# Altium footprint library mainLib.PcbLib: 169 footprints (part 4 of 11)
Each footprint in its own frame and in the unit in brackets; x right, y up, seen from the top. Pads: shape width x height; smd on the part's side, far side on the other; paste and mask are expansions set on the pad; w line width, h text height; cw(c..) or ccw(c..) is an arc to the next point about the centre after c.
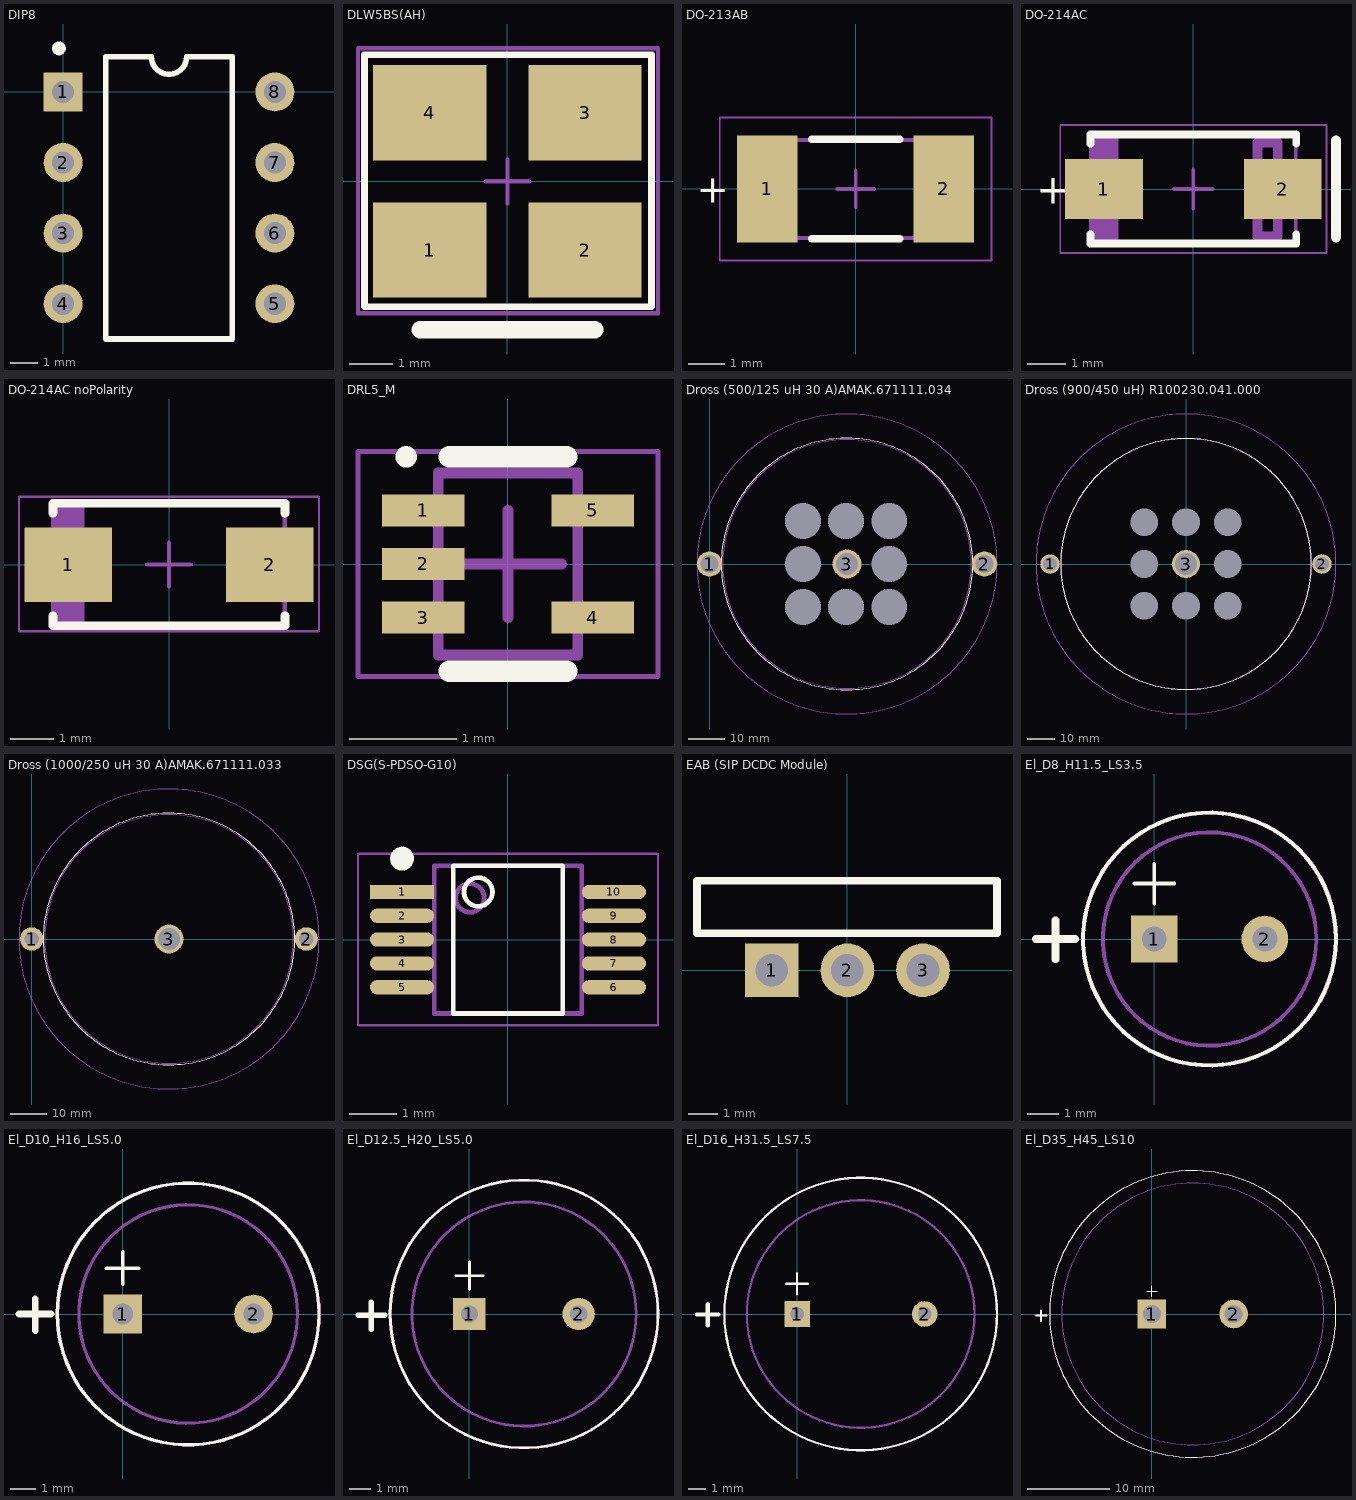
[diagram p3: the footprints below, top view; thin cyan lines are the x and y axes]

## DIP8 [mm]
pads (8):
  rect 1.4x1.4 / inner rect 0x0 / far side rect 1.4x1.4 hole 0.8: 1(0,0)
  round 1.4 / inner round 0 / far side round 1.4 hole 0.8: 2(0,-2.54) 3(0,-5.08) 4(0,-7.62) 5(7.62,-7.62) 6(7.62,-5.08) 7(7.62,-2.54) 8(7.62,0)
Top Overlay:
  circle w0.25: c-0.15,1.565 r0.125
  lines w0.2: 1.535,-8.89 6.085,-8.89 6.085,1.27 4.445,1.27 cw(c3.81,1.27) 3.175,1.27 1.535,1.27 1.535,-8.89
3D body "SW3DPS-DIP8-DEFAULT.STEP": height 3.91, standoff -2.95, extent -0.127,-9.525 7.747,1.905

## DLW5BS(AH) [mil] "SMD Inductor"
height 177.17
pads (4):
  rect 102.24x86 smd: 1(-70,-62) 2(70,-62) 3(70,62) 4(-70,62)
Top Overlay:
  lines w6: -128.94,-113.19 129.92,-113.19 129.92,114.17 -128.94,114.17 -128.94,-113.19
  lines w15.75: -78.74,-133.86 78.74,-133.86
Mechanical 15:
  lines w3.94: -19.69,0 19.68,0 ; 0,-19.69 0,19.68 ; -134.84,-119.09 -134.84,120.08 135.83,120.08 135.83,-119.09 -134.84,-119.09
3D body "User Library-DLW5BT.STEP": height 96.5, standoff 0, extent -98.43,-96.46 98.43,100.39

## DO-213AB [mm] "MELF Diode, 2-Leads, Body 4,95x2,54mm, IPC Low Density"
height 2.67
pads (2):
  rect 1.65x2.9 smd: 1(-2.4,0) 2(2.4,0)
Top Overlay:
  lines w0.2: -1.2,-1.35 1.2,-1.35 ; -1.2,1.35 1.2,1.35
  text "+" at -4.318,-0.381 h0.76
Mechanical 13:
  lines w0.1: -2.6,-1.335 2.6,-1.335 2.6,1.335 -2.6,1.335 -2.6,-1.335
Mechanical 15:
  lines w0.05: -3.7,-1.95 3.7,-1.95 3.7,1.95 -3.7,1.95 -3.7,-1.95
  lines w0.1: -0.5,0 0.5,0 ; 0,-0.5 0,0.5
3D body "DIOMELF5025M.step": height 2.54, standoff 0, extent -2.475,-1.27 2.475,1.27

## DO-214AC [mm] "Molded Diode, 2-Leads, Body 5,10x2,67mm, IPC Medium Density"
height 2.29
pads (2):
  rect 2x1.55 smd: 1(-2.3,0) 2(2.3,0)
Top Overlay:
  lines w0.2: -2.65,-1.175 -2.65,-1.4 2.65,-1.4 2.65,-1.175 ; -2.65,1.175 -2.65,1.4 2.65,1.4 2.65,1.175
  lines w0.254: 3.675,-1.25 3.675,1.25
  text "+" at -4.05,-0.375 h0.76
Mechanical 13:
  rectangle: -2.64,-1.395 -1.93,1.395
  lines w0.1: -2.64,-1.395 2.64,-1.395 2.64,1.395 -2.64,1.395 -2.64,-1.395
  lines w0.254: 1.65,-1.225 2.175,-1.225 2.175,1.2 1.65,1.2 1.65,-1.225
Mechanical 15:
  lines w0.05: -3.425,-1.65 3.425,-1.65 3.425,1.65 -3.425,1.65 -3.425,-1.65
  lines w0.1: -0.5,0 0.5,0 ; 0,-0.5 0,0.5
3D body "DIOM5127X23N.step": height 2.29, standoff 0, extent -2.86,-1.395 2.86,1.395
3D body: height 2.3, standoff 2.29, extent 1.651,-1.224 2.174,1.199

## DO-214AC noPolarity [mm] "Molded Diode, 2-Leads, Body 5,10x2,67mm, IPC Medium Density"
height 2.29
pads (2):
  rect 2x1.7 smd: 1(-2.3,0) 2(2.3,0)
Top Overlay:
  lines w0.2: -2.65,-1.175 -2.65,-1.4 2.65,-1.4 2.65,-1.175 ; -2.65,1.175 -2.65,1.4 2.65,1.4 2.65,1.175
Mechanical 13:
  rectangle: -2.64,-1.395 -1.93,1.395
  lines w0.1: -2.64,-1.395 -2.64,1.395 2.64,1.395 2.64,-1.395 -2.64,-1.395
Mechanical 15:
  lines w0.05: -3.425,-1.525 -3.425,1.55 3.425,1.55 3.425,-1.525 -3.425,-1.525
  lines w0.1: -0.5,0 0.5,0 ; 0,-0.5 0,0.5
3D body "DIOM5127X23N.step": height 2.29, standoff 0, extent -2.86,-1.395 2.86,1.395

## DRL5_M [mm] "SOTFL, 5-Flat Leads, Body 1.2x1.6x0.6mm, Pitch 0.5mm, IPC Low Density"
height 0.6
pads (5):
  rect 0.77x0.3 smd: 1(-0.79,0.5) 2(-0.79,0) 3(-0.79,-0.5) 4(0.79,-0.5) 5(0.79,0.5)
Top Overlay:
  circle w0.1: c-0.95,1 r0.05
  lines w0.2: -0.55,-1 0.55,-1 ; -0.55,1 0.55,1
Mechanical 13:
  lines w0.1: -0.65,-0.85 0.65,-0.85 0.65,0.85 -0.65,0.85 -0.65,-0.85
Mechanical 15:
  lines w0.05: -1.4,-1.05 1.4,-1.05 1.4,1.05 -1.4,1.05 -1.4,-1.05
  lines w0.1: -0.5,0 0.5,0 ; 0,-0.5 0,0.5
3D body: height 0.6, standoff 0, extent -0.65,-0.85 0.65,0.85

## Dross (500/125 uH 30 A)AMAK.671111.034 [mm]
pads (11):
  round 0 hole 10: 0(26,-12) 0(26,0) 0(26,12) 0(38,-12) 0(38,12) 0(50,-12) 0(50,0) 0(50,12)
  round 7 hole 5: 1(0,0) 2(76.5,0)
  round 8 hole 6: 3(38.25,0)
Top Overlay:
  circle w0.254: c38.25,0 r35.001
Mechanical 13:
  circle w0.254: c38.25,0 r34.602
Mechanical 15:
  circle w0.254: c38.25,0 r41.75
3D body: height 37, standoff 0, extent 3.648,-34.602 72.852,34.602
3D body: height 11.56, standoff 0, extent -2.666,-8 13.334,8

## Dross (900/450 uH) R100230.041.000 [mm]
pads (11):
  round 0 hole 10: 0(-15,-15) 0(-15,0) 0(-15,15) 0(0,-15) 0(0,15) 0(15,-15) 0(15,0) 0(15,15)
  round 7 hole 5: 1(-48.8,-0.025) 2(48.8,0)
  round 10 hole 8: 3(0,0)
Top Overlay:
  circle w0.254: c0,0 r45
Mechanical 13:
  circle w0.254: c0,0 r44.904
Mechanical 15:
  circle w0.254: c0,0 r53.825
3D body: height 52, standoff 0, extent -45.005,-45.107 45.2,45.214
3D body: height 11.56, standoff 0, extent -40.916,-8 -24.916,8

## Dross (1000/250 uH 30 A)AMAK.671111.033 [mm]
pads (3):
  round 6.5 hole 4: 1(0,0) 2(76.5,0)
  round 8 hole 6: 3(38.25,0)
Top Overlay:
  circle w0.254: c38.25,0 r35.001
Mechanical 13:
  circle w0.254: c38.25,0 r34.602
Mechanical 15:
  circle w0.254: c38.25,0 r41.75
3D body: height 62, standoff 0, extent 3.648,-34.602 72.852,34.602
3D body: height 11.56, standoff 0, extent -2.666,-8 13.334,8

## DSG(S-PDSO-G10) [mm]
height 1.1
pads (10):
  rect 1.35x0.3 smd mask+0.07: 1(-2.225,1)
  oval 1.35x0.3 smd mask+0.07: 2(-2.225,0.5) 3(-2.225,0) 4(-2.225,-0.5) 5(-2.225,-1) 6(2.225,-1) 7(2.225,-0.5) 8(2.225,0) 9(2.225,0.5) 10(2.225,1)
Top Overlay:
  circle w0.25: c-2.225,1.7 r0.125
  circle w0.1: c-0.625,1 r0.3
  lines w0.1: -1.15,-1.55 -1.15,1.55 1.15,1.55 1.15,-1.55 -1.15,-1.55
Mechanical 13:
  circle w0.1: c-0.8,0.875 r0.3
  lines w0.1: -1.55,-1.55 -1.55,1.55 1.55,1.55 1.55,-1.55 -1.55,-1.55
Mechanical 15:
  lines w0.05: -3.15,-1.8 -3.15,1.8 3.15,1.8 3.15,-1.8 -3.15,-1.8
3D body "DSG(S-PDSO-G10).step": height 1.1, standoff 0, extent -2.45,-1.55 2.45,1.55

## EAB (SIP DCDC Module) [mm]
pads (3):
  rect 1.8x1.8 hole 1.1: 1(-2.54,0)
  round 1.8 hole 1.1: 2(0,0) 3(2.54,0)
Top Overlay:
  lines w0.254: -5.05,1.25 -5.05,3 5.025,3 5.025,1.25 -5.05,1.25
3D body "EAB0003A.stp": height 11.01, standoff -3.99, extent -5,-5.03 5,3.77

## El_D8_H11.5_LS3.5 [mm]
pads (2):
  rect 1.5x1.5 hole 0.8: 1(0,0)
  round 1.5 hole 0.8: 2(3.556,0)
Top Overlay:
  circle w0.127: c1.778,0 r4.064
  lines w0.127: -0.635,1.778 0.635,1.778 ; 0,1.143 0,2.413
  lines w0.254: -3.8,0 -2.55,0 ; -3.175,-0.65 -3.175,0.6
Mechanical 13:
  circle w0.127: c1.778,0 r4.064
  circle w0.127: c1.778,0 r3.429
  circle w0.127: c1.778,0 r4.064
3D body: height 1.02, standoff 0, extent -2.285,-4.063 5.841,4.063
3D body: height 11.56, standoff 2.03, extent -2.285,-4.063 5.841,4.063
3D body: height 2.03, standoff 1.02, extent -1.65,-3.428 5.206,3.428

## El_D10_H16_LS5.0 [mm]
pads (2):
  rect 1.5x1.5 hole 0.8: 1(0,0)
  round 1.5 hole 0.8: 2(5.08,0)
Top Overlay:
  circle w0.127: c2.54,0 r5.08
  lines w0.127: -0.635,1.778 0.635,1.778 ; 0,1.143 0,2.413
  lines w0.254: -4.025,0 -2.775,0 ; -3.4,-0.65 -3.4,0.6
Mechanical 13:
  circle w0.127: c2.54,0 r5.08
  circle w0.127: c2.54,0 r4.242
  circle w0.127: c2.54,0 r5.08
3D body: height 4.06, standoff 2.03, extent -1.701,-4.241 6.781,4.241
3D body: height 2.03, standoff 0, extent -2.539,-5.079 7.619,5.079
3D body: height 11.94, standoff 4.06, extent -2.539,-5.079 7.619,5.079

## El_D12.5_H20_LS5.0 [mm]
pads (2):
  rect 1.5x1.5 hole 0.8: 1(0,0)
  round 1.5 hole 0.8: 2(5.08,0)
Top Overlay:
  circle w0.127: c2.54,0 r6.223
  lines w0.127: -0.635,1.778 0.635,1.778 ; 0,1.143 0,2.413
  lines w0.254: -5.175,-0.05 -3.925,-0.05 ; -4.55,-0.7 -4.55,0.55
Mechanical 13:
  circle w0.127: c2.54,0 r6.223
  circle w0.127: c2.54,0 r5.207
  circle w0.127: c2.54,0 r6.223
3D body: height 2.03, standoff 0, extent -3.682,-6.222 8.762,6.222
3D body: height 16, standoff 4.06, extent -3.682,-6.222 8.762,6.222
3D body: height 4.06, standoff 2.03, extent -2.666,-5.206 7.746,5.206

## El_D16_H31.5_LS7.5 [mm]
pads (2):
  rect 1.5x1.5 hole 0.8: 1(0,0)
  round 1.5 hole 0.8: 2(7.493,0)
Top Overlay:
  circle w0.127: c3.734,0 r8.001
  lines w0.127: -0.635,1.778 0.635,1.778 ; 0,1.143 0,2.413
  lines w0.254: -5.875,-0.025 -4.625,-0.025 ; -5.25,-0.675 -5.25,0.575
Mechanical 13:
  circle w0.127: c3.734,0 r8.001
  circle w0.127: c3.734,0 r6.68
  circle w0.127: c3.734,0 r8.001
3D body: height 2.03, standoff 1.02, extent -2.946,-6.68 10.413,6.68
3D body: height 1.02, standoff 0, extent -4.267,-8 11.734,8
3D body: height 31.5, standoff 2.03, extent -4.267,-8 11.734,8

## El_D35_H45_LS10 [mm]
pads (2):
  rect 3.5x3.5 hole 2.2: 1(0,0)
  round 3.5 hole 2.2 mask+0.102: 2(10,0)
Top Overlay:
  circle w0.127: c5,0 r17.5
  lines w0.127: -0.635,2.803 0.635,2.803 ; 0,2.168 0,3.438
  lines w0.254: -14.15,-0.175 -12.9,-0.175 ; -13.525,-0.825 -13.525,0.425
Mechanical 13:
  circle w0.127: c5,0 r17.5
  circle w0.127: c5,0 r16
  circle w0.127: c5,0 r17.5
3D body: height 5, standoff 3, extent -10.999,-15.999 20.999,15.999
3D body: height 45, standoff 5, extent -12.499,-17.499 22.499,17.499
3D body: height 3, standoff 0, extent -12.499,-17.499 22.499,17.499